# Altium footprint library ACTION_排针排座.PcbLib: 121 footprints (part 8 of 8)
Each footprint in its own frame and in the unit in brackets; x right, y up, seen from the top. Pads: shape width x height; smd on the part's side, far side on the other; paste and mask are expansions set on the pad; w line width, h text height; cw(c..) or ccw(c..) is an arc to the next point about the centre after c.
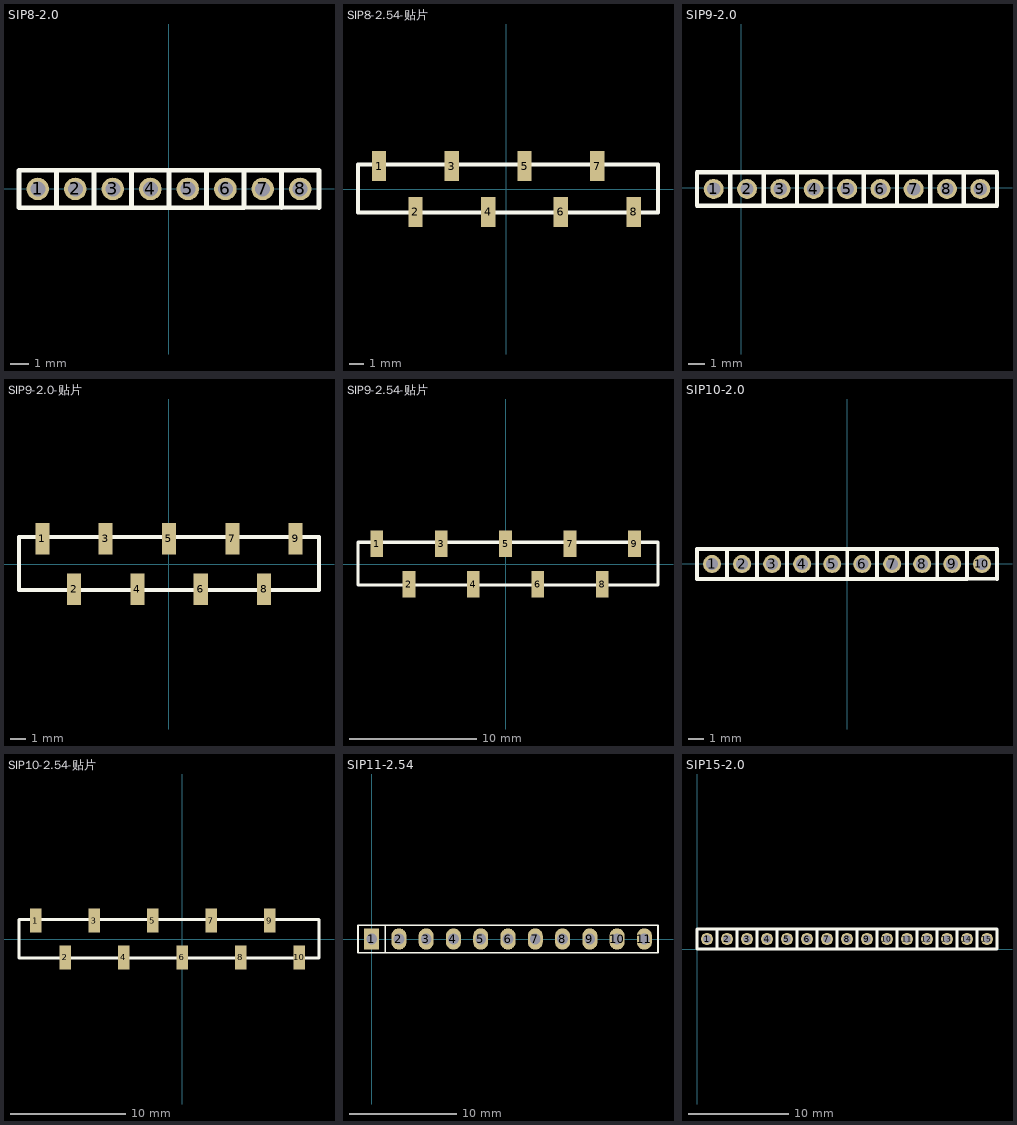
[diagram p7: the footprints below, top view; thin cyan lines are the x and y axes]

## SIP8-2.0 [mm]
pads (8):
  round 1.2 hole 0.8: 1(-6.995,0) 2(-4.995,0) 3(-2.995,0) 4(-0.995,0) 5(1.005,0) 6(3.005,0) 7(4.995,0) 8(6.995,0)
Top Overlay:
  lines w0.254: -5.995,-1 -5.995,1 ; -3.995,-1 -3.995,1 ; -1.995,-1 -1.995,1 ; 0.005,-1 0.005,1 ; 2.005,-1 2.005,1 ; 3.177,1 7.958,1 ; 3.609,-1.002 7.958,-0.981 ; 3.995,-1.005 3.995,0.995 ; 5.995,-1.005 5.995,0.995 ; 7.995,-1.005 7.995,0.995 ; -7.995,-1 -7.995,1 4.005,1 4.005,-1 -7.995,-1
3D body "User Library-PBS2-8.STEP": height 4.32, standoff -3.13, extent -7.967,-0.975 8.033,1.025

## SIP8-2.54-贴片 [mm]
pads (8):
  rect 1x2.1 smd: 1(-8.89,1.595) 2(-6.35,-1.595) 3(-3.81,1.595) 4(-1.27,-1.595) 5(1.27,1.595) 6(3.81,-1.595) 7(6.35,1.595) 8(8.89,-1.595)
Top Overlay:
  lines w0.254: -10.363,-1.646 10.592,-1.646 10.592,1.707 -10.363,1.707 -10.363,-1.646

## SIP9-2.0 [mm]
pads (9):
  round 1.2 hole 0.8: 1(-1.643,-0.086) 2(0.357,-0.086) 3(2.357,-0.086) 4(4.357,-0.086) 5(6.357,-0.086) 6(8.357,-0.086) 7(10.347,-0.086) 8(12.347,-0.086) 9(14.347,-0.086)
Top Overlay:
  lines w0.254: -0.643,-1.086 -0.643,0.914 ; 1.357,-1.086 1.357,0.914 ; 3.357,-1.086 3.357,0.914 ; 5.357,-1.086 5.357,0.914 ; 7.357,-1.086 7.357,0.914 ; 8.529,0.914 15.347,0.914 15.347,-1.087 8.961,-1.087 ; 9.347,-1.091 9.347,0.909 ; 11.347,-1.091 11.347,0.909 ; 13.347,-1.091 13.347,0.909 ; -2.643,-1.086 -2.643,0.914 9.357,0.914 9.357,-1.086 -2.643,-1.086
3D body "User Library-PBS2-9.STEP": height 4.32, standoff -3.13, extent -2.633,-1.102 15.367,0.898

## SIP9-2.0-贴片 [mm]
pads (9):
  rect 0.89x2 smd: 1(-8,1.595) 2(-5.996,-1.595) 3(-4,1.595) 4(-1.996,-1.595) 5(0,1.595) 6(2.004,-1.595) 7(4,1.595) 8(6.004,-1.595) 9(8,1.595)
Top Overlay:
  lines w0.254: -8.635,1.707 -9.473,1.707 -9.473,-1.646 9.475,-1.646 9.475,1.707 -8.559,1.707

## SIP9-2.54-贴片 [mm]
pads (9):
  rect 1x2.1 smd: 1(-10.16,1.595) 2(-7.62,-1.595) 3(-5.08,1.595) 4(-2.54,-1.595) 5(0,1.595) 6(2.54,-1.595) 7(5.08,1.595) 8(7.62,-1.595) 9(10.16,1.595)
Top Overlay:
  lines w0.254: -11.633,-1.646 12.014,-1.646 12.014,1.707 -11.633,1.707 -11.633,-1.646

## SIP10-2.0 [mm]
pads (10):
  round 1.2 hole 0.8: 1(-8.985,0) 2(-6.985,0) 3(-4.985,0) 4(-2.985,0) 5(-0.985,0) 6(1.015,0) 7(3.004,0) 8(5.004,0) 9(7.004,0) 10(8.985,0)
Top Overlay:
  lines w0.254: -7.985,-1 -7.985,1 ; -5.985,-1 -5.985,1 ; -3.985,-1 -3.985,1 ; -1.985,-1 -1.985,1 ; 0.015,-1 0.015,1 ; 1.187,1 8.004,1 8.004,-1.002 1.618,-1.002 ; 2.004,-1.005 2.004,0.995 ; 4.004,-1.005 4.004,0.995 ; 6.004,-1.005 6.004,0.995 ; 7.593,1 9.98,1 ; 7.948,-0.981 9.98,-0.981 ; 7.985,-1.005 7.985,0.995 ; 9.985,-1.002 9.985,1 ; -9.985,-1 -9.985,1 2.015,1 2.015,-1 -9.985,-1

## SIP10-2.54-贴片 [mm]
pads (10):
  rect 1x2.1 smd: 1(-12.7,1.595) 2(-10.16,-1.595) 3(-7.62,1.595) 4(-5.08,-1.595) 5(-2.54,1.595) 6(0,-1.595) 7(2.54,1.595) 8(5.08,-1.595) 9(7.62,1.595) 10(10.16,-1.595)
Top Overlay:
  lines w0.254: -14.173,-1.646 -14.173,1.707 11.887,1.707 11.887,-1.646 -14.173,-1.646

## SIP11-2.54 [mm]
pads (11):
  rect 1.4x2 hole 1: 1(0,0)
  oval 1.4x2 hole 1: 2(2.54,0) 3(5.08,0) 4(7.62,0) 5(10.16,0) 6(12.7,0) 7(15.24,0) 8(17.78,0) 9(20.32,0) 10(22.86,0) 11(25.4,0)
Top Overlay:
  lines w0.15: 1.27,-1.27 1.27,1.27 ; -1.27,-1.27 -1.27,1.27 26.67,1.27 26.67,-1.27 -1.27,-1.27
3D body "Samtec-11.step": height 8.89, standoff -2.03, extent -1.27,-1.27 26.67,1.27

## SIP15-2.0 [mm]
pads (15):
  round 1.2 hole 0.8: 1(1,1) 2(3,1) 3(5,1) 4(7,1) 5(9,1) 6(11,1) 7(13,1) 8(15,1) 9(17,1) 10(19,1) 11(21,1) 12(23,1) 13(25,1) 14(27,1) 15(29,1)
Top Overlay:
  lines w0.254: 2,0 2,2 ; 4,0 4,2 ; 6,0 6,2 ; 8,0 8,2 ; 10,0 10,2 ; 12,0 12,2 ; 14,0 14,2 ; 16,0 16,2 ; 18,0 18,2 ; 20,0 20,2 ; 22,0 22,2 ; 24,0 24,2 ; 26,0 26,2 ; 28,0 28,2 ; 0,0 0,2 30,2 30,0 0,0
3D body "User Library-PBS2-15.STEP": height 4.32, standoff -3.13, extent 0.062,0.102 30.062,2.102